# Altium footprint library nPOC-BB_alpha_main-boardd.PcbLib: 42 footprints (part 2 of 3)
Each footprint in its own frame and in the unit in brackets; x right, y up, seen from the top. Pads: shape width x height; smd on the part's side, far side on the other; paste and mask are expansions set on the pad; w line width, h text height; cw(c..) or ccw(c..) is an arc to the next point about the centre after c.
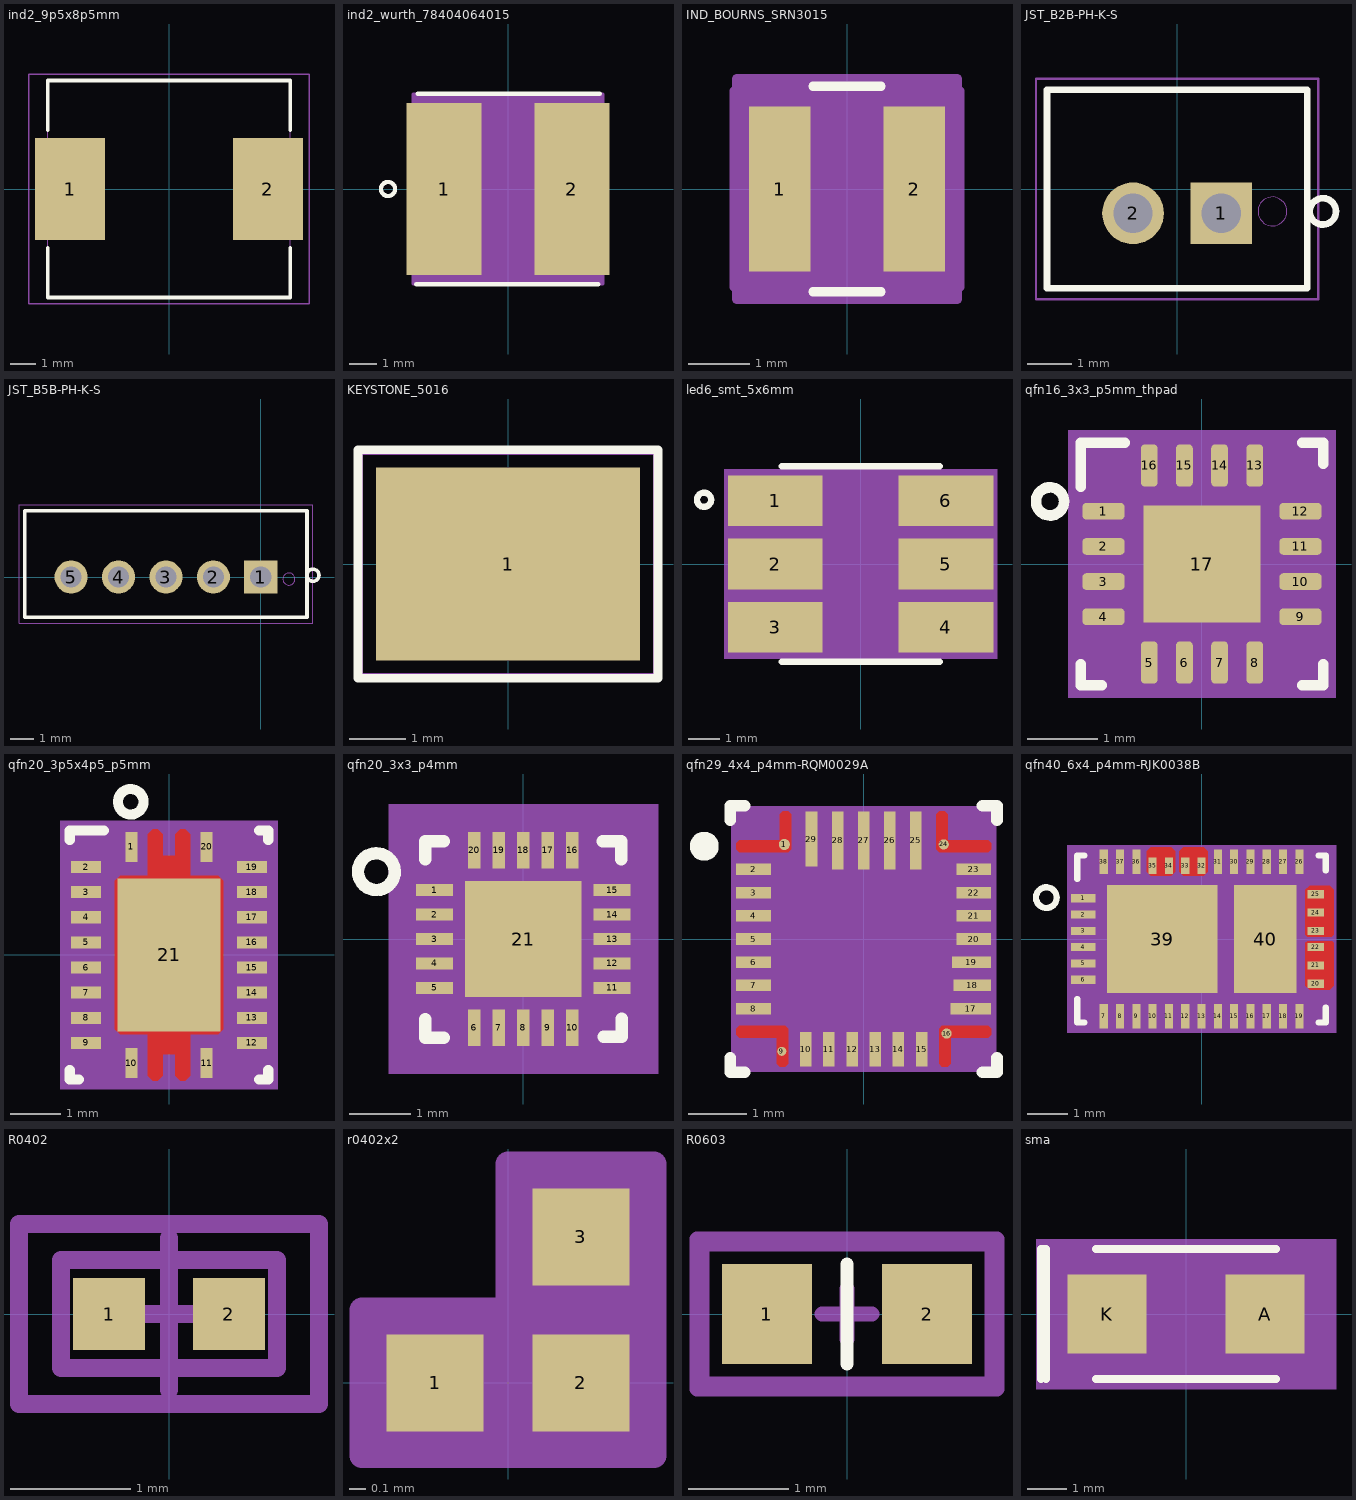
[diagram p1: the footprints below, top view; thin cyan lines are the x and y axes]

## ind2_9p5x8p5mm [mm] "Sumdia CDMC8D28"
height 1
pads (2):
  rect 2.75x4 smd: 1(-3.875,0) 2(3.875,0)
Top Overlay:
  lines w0.15: -4.75,-2.315 -4.75,-4.25 4.75,-4.25 4.75,-2.315 ; -4.75,2.315 -4.75,4.25 4.75,4.25 4.75,2.315
Top Assembly:
  lines w0.025: -4.75,-4.25 4.75,-4.25 4.75,4.25 -4.75,4.25 -4.75,-4.25
Top Courtyard:
  lines w0.05: -5.5,-4.5 5.5,-4.5 5.5,4.5 -5.5,4.5 -5.5,-4.5
3D body "CDMC8D28NP-1R2MC--3DModel-STEP-269445.STEP": height 3, standoff 0, extent -4.75,-4.25 4.75,4.25

## ind2_wurth_78404064015 [mm] "Inductor Wurth 78404064015  WE_LQSA"
height 4.6
pads (2):
  rect 2.7x6.2 smd: 1(-2.3,0) 2(2.3,0)
Top Overlay:
  circle w0.152: c-4.318,0 r0.254
  lines w0.152: -3.302,-3.429 3.251,-3.429 ; -3.251,3.429 3.302,3.429
Top Assembly:
  circle w0: c0,0 r0.076
  lines w0.025: -3.15,-3.15 3.15,-3.15 3.15,3.15 -3.15,3.15 -3.15,-3.15
Top Courtyard:
  region: -3.404,-2.857 -3.404,2.857 -3.404,3.404 3.404,3.404 3.404,2.857 3.404,-2.857 3.404,-3.404 -3.404,-3.404
  lines w0.152: -3.404,-3.404 -3.404,-2.857 -3.404,2.857 -3.404,3.404 3.404,3.404 3.404,2.857 3.404,-2.857 3.404,-3.404 -3.404,-3.404
3D body "IND_WE-LQSA-SMT_6045_WRE.step": height 4.6, standoff 0, extent -3.15,-3.15 3.15,3.15

## IND_BOURNS_SRN3015 [mm] "Bourns Inductor SRN3015 Series"
height 1.5
pads (2):
  rect 1x2.7 smd: 1(-1.1,0) 2(1.1,0)
Top Overlay:
  lines w0.152: -0.556,-1.676 0.556,-1.676 ; -0.556,1.676 0.556,1.676
Top Assembly:
  lines w0.025: -1.549,-1.549 -1.549,1.549 1.549,1.549 1.549,-1.549 -1.549,-1.549
Top Courtyard:
  region: -1.803,-1.6 -1.841,-1.6 -1.841,1.6 -1.803,1.6 -1.803,1.803 1.803,1.803 1.803,1.6 1.841,1.6 1.841,-1.6 1.803,-1.6 1.803,-1.803 -1.803,-1.803
  lines w0.152: -1.841,-1.6 -1.803,-1.6 -1.803,-1.803 1.803,-1.803 1.803,-1.6 1.841,-1.6 1.841,1.6 1.803,1.6 1.803,1.803 -1.803,1.803 -1.803,1.6 -1.841,1.6 -1.841,-1.6
3D body "IND_BOURNS_SRN3015.step": height 1.5, standoff 0, extent -1.549,-1.552 1.549,1.552

## JST_B2B-PH-K-S [mil] "JST 2 pin Vertical connector 2mm pitch"
height 236.22
pads (2):
  rect 55x55 / inner round 55 / far side rect 55x55 hole 35: 1(39.37,-21.65)
  round 55 hole 35: 2(-39.37,-21.65)
Top Overlay:
  circle w6: c130,-20 r11.74
  lines w6: -116.14,-88.58 116.14,-88.58 116.14,88.58 -116.14,88.58 -116.14,-88.58
Top Assembly:
  circle w1: c85,-20 r12.88
  lines w1: -116.14,-88.58 -116.14,88.58 116.14,88.58 116.14,-88.58 -116.14,-88.58
Top Courtyard:
  lines w1.97: -125.98,-98.43 -125.98,98.43 125.98,98.43 125.98,-98.43 -125.98,-98.43
3D body "B2B-PH-K-S(LF)(SN)--3DModel-STEP-56544.STEP": height 236.22, standoff -133.86, extent -116.14,-88.58 116.14,88.58

## JST_B5B-PH-K-S [mil] "JST 5 pin Vertical connector, 2mm pitch"
height 236.22
pads (5):
  rect 55x55 / inner round 55 / far side rect 55x55 hole 35: 1(0,0)
  round 55 hole 35: 2(-78.74,0) 3(-157.48,0) 4(-236.22,0) 5(-314.96,0)
Top Overlay:
  circle w6: c86.77,3.06 r10
  lines w6: -391.73,-66.93 -391.73,110.24 76.77,110.24 76.77,-66.93 -391.73,-66.93
Top Assembly:
  circle w1: c46.89,-3.35 r10
  lines w1: -391.73,-66.93 76.77,-66.93 76.77,110.24 -391.73,110.24 -391.73,-66.93
Top Courtyard:
  lines w1.97: -401.57,-76.77 86.61,-76.77 86.61,120.08 -401.57,120.08 -401.57,-76.77
3D body "B5B-PH-K-S-LF--SN---3DModel-STEP-56544.STEP": height 236.22, standoff -133.86, extent -391.73,-66.93 76.77,110.24

## KEYSTONE_5016 [mm] "Keystone SMT Test clip 5016"
height 2.29
pads (1):
  rect 4.7x3.43 smd: 1(0,0)
Top Overlay:
  lines w0.152: -2.667,-2.032 2.667,-2.032 2.667,2.032 -2.667,2.032 -2.667,-2.032
Top Assembly:
  lines w0.025: -1.905,-1.42 1.905,-1.42 1.905,1.42 -1.905,1.42 -1.905,-1.42
Top Courtyard:
  lines w0.05: -2.6,-1.965 -2.6,1.965 2.6,1.965 2.6,-1.965 -2.6,-1.965
3D body "5016.step": height 2.29, standoff 0, extent -1.905,-1.422 1.905,1.422

## led6_smt_5x6mm [mm] "Kingbright  AAAF5060QFBSURZGS"
height 2.3
pads (6):
  rect 3x1.6 smd: 1(-2.7,2) 2(-2.7,0) 3(-2.7,-2) 4(2.7,-2) 5(2.7,0) 6(2.7,2)
Top Overlay:
  circle w0.2: c-4.953,2.032 r0.224
  lines w0.203: -2.5,-3.1 2.5,-3.1 ; -2.5,3.1 2.5,3.1
Top Assembly:
  circle w0.025: c0,0 r2
  circle w0.025: c-1.9,2.1 r0.3
  lines w0.025: -2.5,-2.6 -2.9,-2.6 -2.9,-1.4 -2.5,-1.4 ; -2.5,-0.6 -2.9,-0.6 -2.9,0.6 -2.5,0.6 ; -2.5,1.4 -2.9,1.4 -2.9,2.6 -2.5,2.6 ; 2.5,-2.6 2.9,-2.6 2.9,-1.4 2.5,-1.4 ; 2.5,-0.6 2.9,-0.6 2.9,0.6 2.5,0.6 ; 2.5,1.4 2.9,1.4 2.9,2.6 2.5,2.6 ; -2.5,-3 2.5,-3 2.5,3 -2.5,3 -2.5,-3
Top Courtyard:
  region: -0.6,3 -4.318,3 -4.318,-3 4.318,-3 4.318,3 0.2,3
3D body: height 2.3, standoff 0, extent -2.54,-3.048 2.54,3.048

## qfn16_3x3_p5mm_thpad [mm] "QFN 16 pin, 3x3mm. 0.8mm height with thermal pad.  TI - RTE0016C"
height 0.8
pads (17):
  rrect50% 0.6x0.24 smd: 1(-1.4,0.75) 2(-1.4,0.25) 3(-1.4,-0.25) 4(-1.4,-0.75) 9(1.4,-0.75) 10(1.4,-0.25) 11(1.4,0.25) 12(1.4,0.75)
  rrect50% 0.24x0.6 smd: 5(-0.75,-1.4) 6(-0.25,-1.4) 7(0.25,-1.4) 8(0.75,-1.4) 13(0.75,1.4) 14(0.25,1.4) 15(-0.25,1.4) 16(-0.75,1.4)
  rect 1.66x1.66 smd: 17(0,0)
Top Overlay:
  circle w0.15: c-2.159,0.889 r0.2
  lines w0.15: -1.725,-1.425 -1.725,-1.725 -1.425,-1.725 ; -1.725,1.1 -1.725,1.725 -1.1,1.725 ; 1.425,-1.725 1.725,-1.725 1.725,-1.425 ; 1.425,1.725 1.725,1.725 1.725,1.425
Top Paste:
  region: -0.756,0.756 -0.756,-0.756 0.756,-0.756 0.756,0.756
Top Assembly:
  circle w0.025: c-1.15,1.025 r0.2
  lines w0.025: -1.575,-1.575 1.575,-1.575 1.575,1.575 -1.575,1.575 -1.575,-1.575
Top Courtyard:
  rectangle: -1.905,-1.905 1.905,1.905
3D body "RTE0016C.stp": height 0.8, standoff 0, extent -1.5,-1.5 1.5,1.5

## qfn20_3p5x4p5_p5mm [mm] "QFN 20 pin, 3.5 x 4.5mm, 0.5mm pitch, 1mm height"
height 1
pads (21):
  rect 0.24x0.6 smd paste+0 mask+0.051: 1(-0.75,2.15) 10(-0.75,-2.15) 11(0.75,-2.15) 20(0.75,2.15)
  rect 0.6x0.24 smd paste+0 mask+0.051: 2(-1.65,1.75) 3(-1.65,1.25) 4(-1.65,0.75) 5(-1.65,0.25) 6(-1.65,-0.25) 7(-1.65,-0.75) 8(-1.65,-1.25) 9(-1.65,-1.75) 12(1.65,-1.75) 13(1.65,-1.25) 14(1.65,-0.75) 15(1.65,-0.25) 16(1.65,0.25) 17(1.65,0.75) 18(1.65,1.25) 19(1.65,1.75)
  rect 2.05x3.05 smd paste-1.512 mask+0: 21(0,0)
Top Layer:
  region: -1.075,-1.475 -0.975,-1.575 -0.425,-1.575 -0.425,-2.4 -0.325,-2.5 -0.225,-2.5 -0.125,-2.4 -0.125,-1.975 0.125,-1.975 0.125,-2.4 0.225,-2.5 0.325,-2.5 0.425,-2.4 0.425,-1.575 0.975,-1.575 1.075,-1.475 1.075,1.475 0.975,1.575 0.425,1.575 0.425,2.4 0.325,2.5 0.225,2.5 0.125,2.4 0.125,1.975 -0.125,1.975 -0.125,2.4 -0.225,2.5 -0.325,2.5 -0.425,2.4 -0.425,1.575 -0.975,1.575 -1.075,1.475
Top Overlay:
  circle w0.2: c-0.762,3.048 r0.254
  lines w0.2: -1.975,-2.29 -1.975,-2.475 -1.79,-2.475 ; -1.975,2.29 -1.975,2.475 -1.29,2.475 ; 1.79,-2.475 1.975,-2.475 1.975,-2.29 ; 1.79,2.475 1.975,2.475 1.975,2.29
Top Paste:
  drawing of 8 lines, arcs and shapes, not listed
Top Solder:
  region: -0.425,-1.525 -0.954,-1.525 -1.025,-1.454 -1.025,1.454 -0.954,1.525 -0.425,1.525 -0.415,1.526 -0.406,1.529 -0.397,1.533 -0.39,1.54 -0.383,1.547 -0.379,1.556 -0.376,1.565 -0.375,1.575 -0.375,2.379 -0.304,2.45 -0.246,2.45 -0.175,2.379 -0.175,1.975 -0.174,1.965 -0.171,1.956 -0.166,1.947 -0.16,1.94 -0.153,1.933 -0.144,1.929 -0.135,1.926 -0.125,1.925 0.125,1.925 0.135,1.926 0.144,1.929 0.153,1.933 0.16,1.94 0.167,1.947 0.171,1.956 0.174,1.965 0.175,1.975 0.175,2.379 0.246,2.45 0.304,2.45 0.375,2.379 0.375,1.575 0.376,1.565 0.379,1.556 0.384,1.547 0.39,1.54 0.397,1.533 0.406,1.529 0.415,1.526 0.425,1.525 0.954,1.525 1.025,1.454 1.025,-1.454 0.954,-1.525 0.425,-1.525 0.415,-1.526 0.406,-1.529 0.397,-1.534 0.39,-1.54 0.384,-1.547 0.379,-1.556 0.376,-1.565 0.375,-1.575 0.375,-2.379 0.304,-2.45 0.246,-2.45 0.175,-2.379 0.175,-1.975 0.174,-1.965 0.171,-1.956 0.167,-1.947 0.16,-1.94 0.153,-1.934 0.144,-1.929 0.135,-1.926 0.125,-1.925 -0.125,-1.925 -0.135,-1.926 -0.144,-1.929 -0.153,-1.934 -0.16,-1.94 -0.166,-1.947 -0.171,-1.956 -0.174,-1.965 -0.175,-1.975 -0.175,-2.379 -0.246,-2.45 -0.304,-2.45 -0.375,-2.379 -0.375,-1.575 -0.376,-1.565 -0.379,-1.556 -0.383,-1.547 -0.39,-1.54 -0.397,-1.534 -0.406,-1.529 -0.415,-1.526
Top Assembly:
  circle w0.025: c-0.75,1.775 r0.3
  lines w0.025: -1.825,-2.325 -1.825,2.325 1.825,2.325 1.825,-2.325 -1.825,-2.325
Top Courtyard:
  region: -2.159,2.667 2.159,2.667 2.159,-2.667 -2.159,-2.667
3D body "RHL0020A.stp": height 0.97, standoff -0.03, extent -1.75,-2.25 1.75,2.25

## qfn20_3x3_p4mm [mm] "qfn 20pin 3x3mm 0.4mm pitch  0.8mm height"
height 0.02
pads (21):
  rect 0.6x0.2 smd: 1(-1.45,0.8) 2(-1.45,0.4) 3(-1.45,0) 4(-1.45,-0.4) 5(-1.45,-0.8) 11(1.45,-0.8) 12(1.45,-0.4) 13(1.45,0) 14(1.45,0.4) 15(1.45,0.8)
  rect 0.2x0.6 smd: 6(-0.8,-1.45) 7(-0.4,-1.45) 8(0,-1.45) 9(0.4,-1.45) 10(0.8,-1.45) 16(0.8,1.45) 17(0.4,1.45) 18(0,1.45) 19(-0.4,1.45) 20(-0.8,1.45)
  rect 1.9x1.9 smd paste+0: 21(0,0)
Top Overlay:
  lines w0.203: -2.4,0.8 cw(c-2.4,1.1) -2.337,0.807 ; -1.6,-1.31 -1.6,-1.61 -1.3,-1.61 ; -1.6,1.3 -1.6,1.6 -1.3,1.6 ; 1.3,1.6 1.6,1.6 1.6,1.3 ; 1.31,-1.6 1.61,-1.6 1.61,-1.3
Top Paste:
  region: -0.1,-0.1 -0.9,-0.1 -0.9,-0.9 -0.1,-0.9
  region: 0.1,0.1 0.1,0.9 0.9,0.9 0.9,0.1
  region: -0.1,0.1 -0.9,0.1 -0.9,0.9 -0.1,0.9
  region: 0.1,-0.1 0.1,-0.9 0.9,-0.9 0.9,-0.1
Top Solder:
  dashed: -1,1 1,1 1,-1 -1,-1
Top Assembly:
  circle w0.025: c-0.96,0.96 r0.3
  lines w0.025: -1.5,-1.5 -1.5,1.5 1.5,1.5 1.5,-1.5 -1.5,-1.5
Top Courtyard:
  region: 2.2,-1.7 2.2,1.7 2.2,2.2 -2.2,2.2 -2.2,1.7 -2.2,-1.7 -2.2,-2.2 2.2,-2.2
3D body "User Library-QFN40P300X300X60-20.step": height 0.6, standoff 0, extent -1.55,-1.55 1.55,1.55

## qfn29_4x4_p4mm-RQM0029A [mm] "QFN 29 pin, 4x4mm, 0.4mm pitch, TI RQM0029A package"
height 1
pads (29):
  round 0.192 smd paste+0 mask+0.05: 1(-1.369,1.631)
  rect 0.6x0.2 smd mask+0.05: 2(-1.9,1.2) 3(-1.9,0.8) 4(-1.9,0.4) 5(-1.9,0) 6(-1.9,-0.4) 7(-1.9,-0.8) 8(-1.9,-1.2) 20(1.9,0) 21(1.9,0.4) 22(1.9,0.8) 23(1.9,1.2)
  round 0.158 smd paste+0 mask+0.05: 9(-1.412,-1.937)
  rect 0.2x0.6 smd mask+0.05: 10(-1,-1.9) 11(-0.6,-1.9) 12(-0.2,-1.9) 13(0.2,-1.9) 14(0.6,-1.9) 15(1,-1.9)
  round 0.175 smd paste+0 mask+0.05: 16(1.431,-1.631) 24(1.381,1.631)
  rect 0.7x0.2 smd mask+0.05: 17(1.85,-1.2)
  rect 0.65x0.2 smd mask+0.05: 18(1.875,-0.8)
  rect 0.68x0.2 smd mask+0.05: 19(1.86,-0.4)
  rect 0.2x1 smd mask+0.05: 25(0.9,1.7) 26(0.45,1.7) 27(0,1.7) 28(-0.45,1.7)
  rect 0.2x0.95 smd mask+0.05: 29(-0.9,1.725)
Top Layer:
  region: -2.2,1.55 -2.2,1.65 -2.15,1.7 -1.45,1.7 -1.45,2.15 -1.4,2.2 -1.3,2.2 -1.25,2.15 -1.25,1.55 -1.3,1.5 -2.15,1.5
  region: -2.2,-1.55 -2.2,-1.65 -2.15,-1.7 -1.5,-1.7 -1.5,-2.15 -1.45,-2.2 -1.35,-2.2 -1.3,-2.15 -1.3,-1.55 -1.35,-1.5 -2.15,-1.5
  region: 2.2,-1.55 2.2,-1.65 2.15,-1.7 1.5,-1.7 1.5,-2.15 1.45,-2.2 1.35,-2.2 1.3,-2.15 1.3,-1.55 1.35,-1.5 2.15,-1.5
  region: 2.2,1.55 2.2,1.65 2.15,1.7 1.45,1.7 1.45,2.15 1.4,2.2 1.3,2.2 1.25,2.15 1.25,1.55 1.3,1.5 2.15,1.5
Top Overlay:
  circle w0.25: c-2.75,1.6 r0.125
  lines w0.2: -2.3,-2.05 -2.3,-2.3 -2.05,-2.3 ; -2.3,2.05 -2.3,2.3 -2.05,2.3 ; 2.05,-2.3 2.3,-2.3 2.3,-2.05 ; 2.05,2.3 2.3,2.3 2.3,2.05
Top Paste:
  region: -2.2,1.55 -2.2,1.65 -2.15,1.7 -1.45,1.7 -1.45,2.15 -1.4,2.2 -1.3,2.2 -1.25,2.15 -1.25,1.55 -1.3,1.5 -2.15,1.5
  region: 2.15,1.7 2.2,1.65 2.2,1.55 2.15,1.5 1.3,1.5 1.25,1.55 1.25,2.15 1.3,2.2 1.4,2.2 1.45,2.15 1.45,1.7
  region: -2.15,-1.7 -2.2,-1.65 -2.2,-1.55 -2.15,-1.5 -1.35,-1.5 -1.3,-1.55 -1.3,-2.15 -1.35,-2.2 -1.45,-2.2 -1.5,-2.15 -1.5,-1.7
  region: 2.2,-1.55 2.2,-1.65 2.15,-1.7 1.5,-1.7 1.5,-2.15 1.45,-2.2 1.35,-2.2 1.3,-2.15 1.3,-1.55 1.35,-1.5 2.15,-1.5
Top Solder:
  region: 2.25,-1.45 2.25,-1.68 2.18,-1.75 1.55,-1.75 1.55,-2.17 1.47,-2.25 1.25,-2.25 1.25,-1.53 1.33,-1.45
  region: 2.18,1.75 2.25,1.68 2.25,1.45 1.27,1.45 1.2,1.52 1.2,2.19 1.26,2.25 1.43,2.25 1.5,2.18 1.5,1.75
  region: -2.25,1.45 -2.25,1.67 -2.17,1.75 -1.5,1.75 -1.5,2.18 -1.43,2.25 -1.27,2.25 -1.2,2.18 -1.2,1.52 -1.27,1.45
  region: -2.19,-1.75 -2.25,-1.69 -2.25,-1.45 -1.32,-1.45 -1.25,-1.52 -1.25,-2.25 -1.49,-2.25 -1.55,-2.19 -1.55,-1.75
Top Assembly:
  circle w0.025: c-1.397,1.524 r0.254
  lines w0.025: -2.05,-2.05 2.05,-2.05 2.05,2.05 -2.05,2.05 -2.05,-2.05
Top Courtyard:
  region: -2.286,2.286 2.286,2.286 2.286,-2.286 -2.286,-2.286
3D body "RQM0029A.stp": height 1, standoff 0, extent -2,-2 2,2

## qfn40_6x4_p4mm-RJK0038B [mm] "QFN 40 pin, 6x4mm, 0.4mm pitch - TI RJK0038B package"
height 0.8
pads (40):
  rect 0.6x0.2 smd: 1(-2.9,1) 2(-2.9,0.6) 3(-2.9,0.2) 4(-2.9,-0.2) 5(-2.9,-0.6) 6(-2.9,-1)
  rect 0.2x0.6 smd: 7(-2.4,-1.9) 8(-2,-1.9) 9(-1.6,-1.9) 10(-1.2,-1.9) 11(-0.8,-1.9) 12(-0.4,-1.9) 13(0,-1.9) 14(0.4,-1.9) 15(0.8,-1.9) 16(1.2,-1.9) 17(1.6,-1.9) 18(2,-1.9) 19(2.4,-1.9) 26(2.4,1.9) 27(2,1.9) 28(1.6,1.9) 29(1.2,1.9) 30(0.8,1.9) 31(0.4,1.9) 36(-1.6,1.9) 37(-2,1.9) 38(-2.4,1.9)
  rect 0.4x0.2 smd: 20(2.8,-1.1) 21(2.8,-0.65) 22(2.8,-0.2) 23(2.8,0.2) 24(2.8,0.65) 25(2.8,1.1)
  rect 0.2x0.4 smd: 32(0,1.8) 33(-0.4,1.8) 34(-0.8,1.8) 35(-1.2,1.8)
  rect 2.72x2.65 smd: 39(-0.965,0)
  rect 1.53x2.65 smd: 40(1.56,0)
Top Layer:
  region: -1.35,1.65 -1.35,2.15 -1.25,2.25 -0.75,2.25 -0.65,2.15 -0.65,1.65 -0.75,1.55 -1.25,1.55
  region: -0.55,1.65 -0.55,2.15 -0.45,2.25 0.05,2.25 0.15,2.15 0.15,1.65 0.05,1.55 -0.45,1.55
  region: 2.55,0.15 2.55,1.203 2.65,1.303 3.15,1.303 3.25,1.203 3.25,0.15 3.2,0.1 2.6,0.1
  region: 2.55,0.1 2.55,1.203 2.65,1.303 3.15,1.303 3.25,1.203 3.25,0.1 3.2,0.05 2.6,0.05
  region: 2.55,-1.15 2.55,-0.097 2.597,-0.05 3.203,-0.05 3.25,-0.097 3.25,-1.15 3.15,-1.25 2.65,-1.25
Top Overlay:
  circle w0.152: c-3.81,1.016 r0.254
  lines w0.152: -3.05,-1.475 -3.05,-2.05 -2.875,-2.05 ; -3.05,1.475 -3.05,2.05 -2.875,2.05 ; 2.875,-2.05 3.05,-2.05 3.05,-1.678 ; 2.875,2.05 3.05,2.05 3.05,1.678
Top Paste:
  region: 3.15,0.1 2.9,0.1 2.65,0.1 2.6,0.15 2.6,1.203 2.65,1.253 3.15,1.253 3.2,1.203 3.2,1.05 3.15,1 2.925,1 2.875,0.95 2.875,0.8 2.925,0.75 3.15,0.75 3.2,0.7 3.2,0.6 3.15,0.55 2.925,0.55 2.875,0.5 2.875,0.35 2.925,0.3 3.15,0.3 3.2,0.25 3.2,0.15
  region: 3.15,-0.1 2.9,-0.1 2.65,-0.1 2.6,-0.15 2.6,-1.203 2.65,-1.253 3.15,-1.253 3.2,-1.203 3.2,-1.05 3.15,-1 2.925,-1 2.875,-0.95 2.875,-0.8 2.925,-0.75 3.15,-0.75 3.2,-0.7 3.2,-0.6 3.15,-0.55 2.925,-0.55 2.875,-0.5 2.875,-0.35 2.925,-0.3 3.15,-0.3 3.2,-0.25 3.2,-0.15
  region: -0.1,2.15 -0.05,2.2 0.05,2.2 0.1,2.15 0.1,1.65 0.05,1.6 -0.45,1.6 -0.5,1.65 -0.5,2.15 -0.45,2.2 -0.35,2.2 -0.3,2.15 -0.3,1.925 -0.25,1.875 -0.15,1.875 -0.1,1.925
  region: -0.9,2.15 -0.85,2.2 -0.75,2.2 -0.7,2.15 -0.7,1.65 -0.75,1.6 -1.25,1.6 -1.3,1.65 -1.3,2.15 -1.25,2.2 -1.15,2.2 -1.1,2.15 -1.1,1.925 -1.05,1.875 -0.95,1.875 -0.9,1.925
  region: -1.065,1.225 -1.065,0.155 -1.115,0.105 -2.215,0.105 -2.265,0.155 -2.265,1.225 -2.215,1.275 -1.115,1.275
  region: -2.265,-1.225 -2.265,-0.155 -2.215,-0.105 -1.115,-0.105 -1.065,-0.155 -1.065,-1.225 -1.115,-1.275 -2.215,-1.275
  region: 0.285,-1.275 -0.815,-1.275 -0.865,-1.225 -0.865,-0.155 -0.815,-0.105 0.285,-0.105 0.335,-0.155 0.335,-1.225
  region: 0.285,0.105 -0.815,0.105 -0.865,0.155 -0.865,1.225 -0.815,1.275 0.285,1.275 0.335,1.225 0.335,0.155
  region: 2.235,1.225 2.235,0.155 2.185,0.105 0.935,0.105 0.885,0.155 0.885,1.225 0.935,1.275 2.185,1.275
  region: 0.935,-0.105 2.185,-0.105 2.235,-0.155 2.235,-1.225 2.185,-1.275 0.935,-1.275 0.885,-1.225 0.885,-0.155
Top Solder:
  drawing of 34 lines, arcs and shapes, not listed
Top Assembly:
  circle w0.025: c-2.667,1.016 r0.127
  lines w0.025: -3.05,-2.05 3.05,-2.05 3.05,2.05 -3.05,2.05 -3.05,-2.05
Top Courtyard:
  region: -3.3,2.3 3.3,2.3 3.3,-2.3 -3.3,-2.3
3D body "RJK0038B.stp": height 0.8, standoff 0, extent -3,-2 3,2

## R0402 [mm] "R0402"
height 0.56
pads (2):
  rect 0.6x0.6 smd: 1(-0.5,0) 2(0.5,0)
Top Assembly:
  lines w0.15: -0.9,-0.45 0.9,-0.45 0.9,0.45 -0.9,0.45 -0.9,-0.45
Top Component Center:
  lines w0.15: -0.635,0 0.635,0 ; 0,-0.635 0,0.635
Top Courtyard:
  lines w0.15: -1.25,-0.75 1.25,-0.75 1.25,0.75 -1.25,0.75 -1.25,-0.75
3D body "0402.STEP": height 0.35, standoff 0, extent -0.5,-0.25 0.5,0.25

## r0402x2 [mm] "Dual 0402 with shared pin"
pads (3):
  rect 0.6x0.6 smd: 1(-0.45,0) 2(0.45,0) 3(0.45,0.9)
Top Solder:
  dashed: 0.08,1.27 0.82,1.27 0.82,-0.37 -0.82,-0.37 -0.82,0.37 0.08,0.37
Top Assembly:
  lines w0.152: -0.9,-0.45 -0.9,0.45 0,0.45 0,1.35 0.9,1.35 0.9,-0.45 -0.9,-0.45
Top Component Center:
  lines w0.127: -0.381,0 0.381,0 ; 0,-0.381 0,0.381
Top Courtyard:
  region: -0.9,-0.5 0.9,-0.5 0.9,0.5 0.9,1.3 0,1.3 0,0.5 -0.9,0.5
3D body "0402.STEP": height 0.35, standoff 0, extent -0.5,-0.25 0.5,0.25

## R0603 [mm] "R0603"
height 0.55
pads (2):
  rect 0.9x1 smd: 1(-0.8,0) 2(0.8,0)
Top Overlay:
  lines w0.127: 0,-0.5 0,0.5
Top Assembly:
  lines w0.15: -1.45,-0.7 1.45,-0.7 1.45,0.7 -1.45,0.7 -1.45,-0.7
Top Component Center:
  lines w0.15: -0.25,0 0.25,0 ; 0,-0.25 0,0.25
Top Courtyard:
  lines w0.15: -1.5,-0.75 1.5,-0.75 1.5,0.75 -1.5,0.75 -1.5,-0.75
3D body "0603.STEP": height 0.45, standoff 0, extent -0.8,-0.4 0.8,0.4

## sma [mil] "Diode SMA"
height 94.49
pads (2):
  rect 79x79 smd: A(79,0) K(-79,0)
Top Overlay:
  lines w8: -145,-65 -145,65 -140,65 -140,-65 ; -90,-65 90,-65 ; -90,65 90,65
Top Assembly:
  lines w1: -90,-40 -110,-40 -110,40 -90,40 ; -90,-30 ccw(c-90,0) -90,30 ; 90,-40 110,-40 110,40 90,40 ; -90,-60 -90,60 90,60 90,-60 -90,-60
Top Courtyard:
  region: 150,75 -150,75 -150,-75 150,-75
3D body "Diode SMA.stp": height 94.95, standoff 0, extent -105,-57.48 102.87,57.48